# Altium footprint library altium_parts_templates_PCB.PcbLib: 93 footprints (part 2 of 6)
Each footprint in its own frame and in the unit in brackets; x right, y up, seen from the top. Pads: shape width x height; smd on the part's side, far side on the other; paste and mask are expansions set on the pad; w line width, h text height; cw(c..) or ccw(c..) is an arc to the next point about the centre after c.
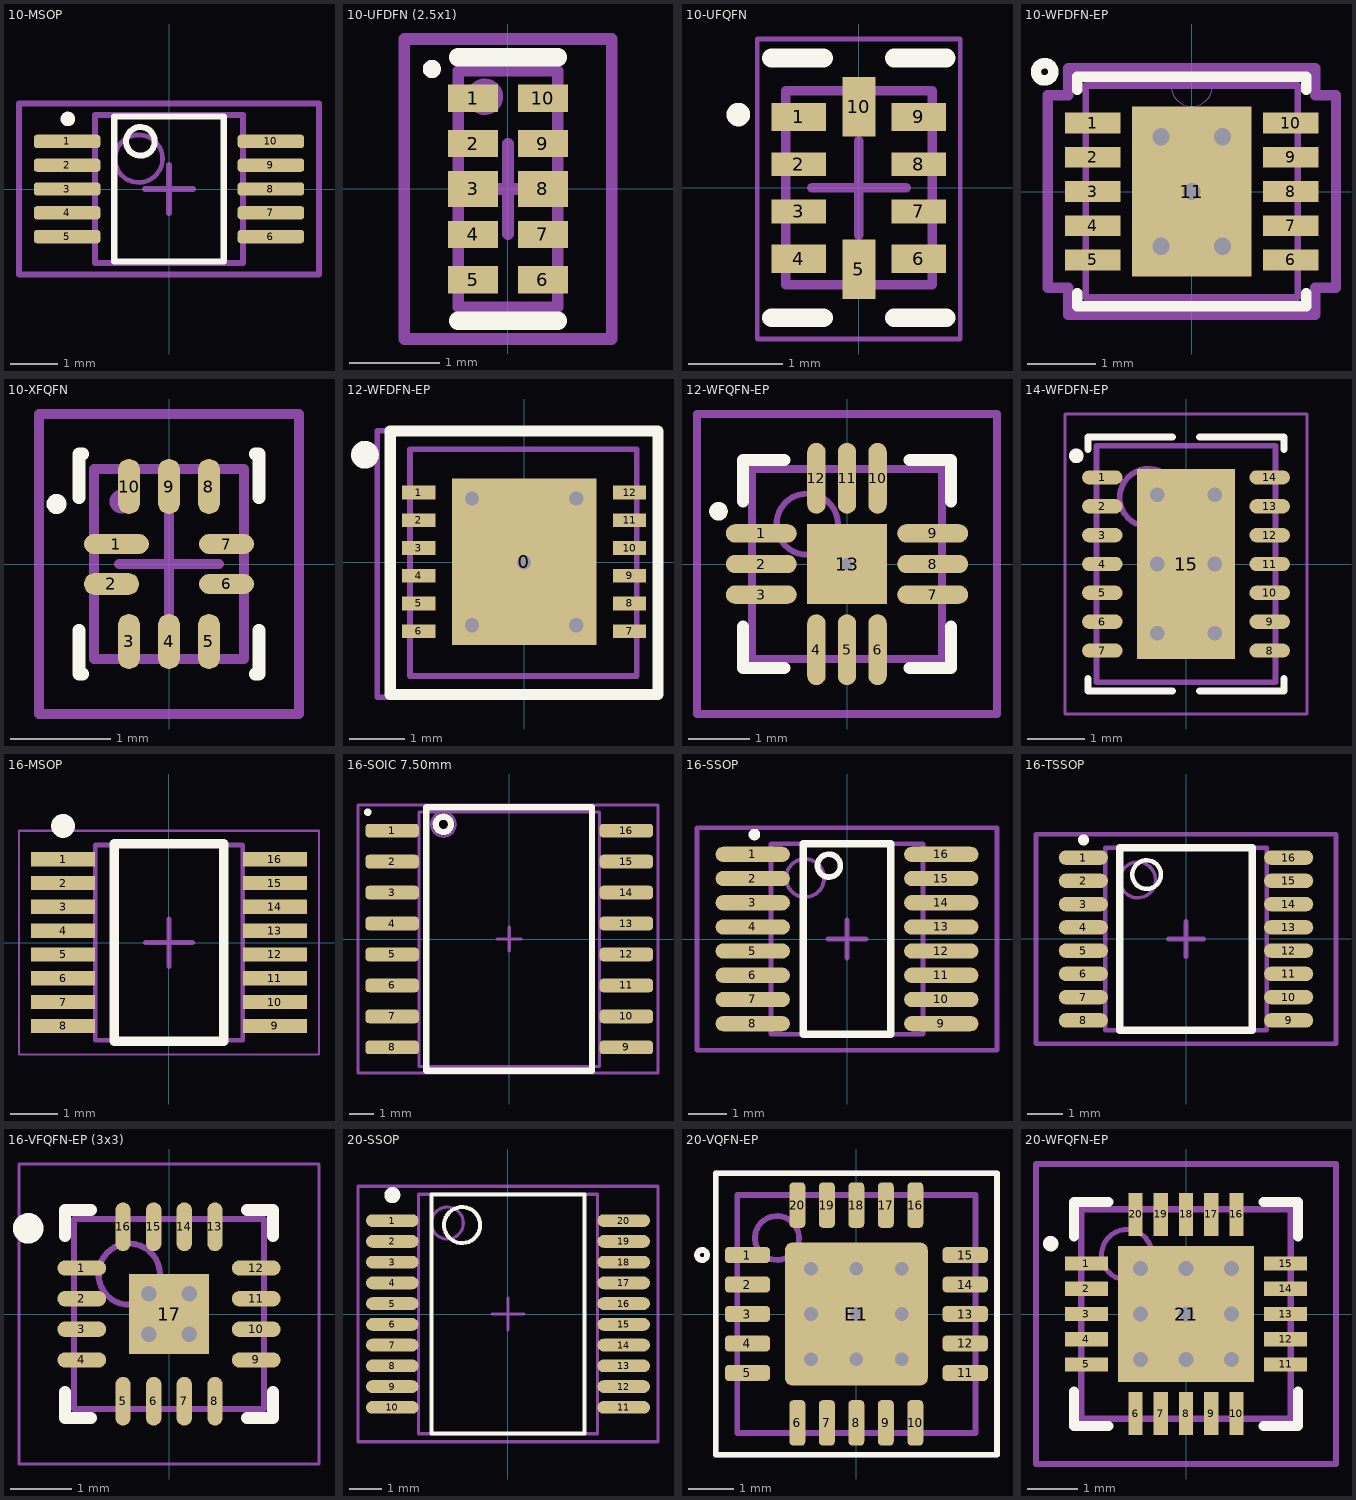
[diagram p1: the footprints below, top view; thin cyan lines are the x and y axes]

## 10-MSOP [mm] "10-MSOP, 10-TFSOP, 10-uMAX"
height 1.1
pads (10):
  rrect50% 1.4x0.28 smd paste+0 mask+0.05: 1(-2.14,1) 2(-2.14,0.5) 3(-2.14,0) 4(-2.14,-0.5) 5(-2.14,-1) 6(2.14,-1) 7(2.14,-0.5) 8(2.14,0) 9(2.14,0.5) 10(2.14,1)
Top Overlay:
  circle w0.152: c-2.125,1.471 r0.076
  circle w0.127: c-0.6,1 r0.3
  lines w0.127: -1.15,-1.525 1.15,-1.525 1.15,1.525 -1.15,1.525 -1.15,-1.525
Top Assembly Drawing:
  circle w0.1: c-0.637,0.637 r0.5
  lines w0.127: -1.55,-1.55 1.55,-1.55 1.55,1.55 -1.55,1.55 -1.55,-1.55
Top Courtyard:
  lines w0.127: -0.5,0 0.5,0 ; 0,-0.5 0,0.5 ; -3.15,-1.8 3.15,-1.8 3.15,1.8 -3.15,1.8 -3.15,-1.8
3D body "REG_REF_MAX6072AAUB25+.step": height 1.1, standoff 0, extent -2.45,-1.55 2.45,1.55

## 10-UFDFN (2.5x1) [mm] "10-UFDFN, 10-USON (2.5x1)"
height 0.55
pads (10):
  rect 0.55x0.3 smd paste+0 mask+0.05: 1(-0.385,1) 2(-0.385,0.5) 4(-0.385,-0.5) 5(-0.385,-1) 6(0.385,-1) 7(0.385,-0.5) 9(0.385,0.5) 10(0.385,1)
  rect 0.55x0.4 smd paste+0 mask+0.05: 3(-0.385,0) 8(0.385,0)
Top Overlay:
  circle w0.1: c-0.838,1.321 r0.05
  lines w0.2: -0.55,-1.45 0.55,-1.45 ; -0.55,1.45 0.55,1.45
Top Assembly Drawing:
  circle w0.1: c-0.254,1.016 r0.15
  lines w0.127: -0.55,-1.3 -0.55,1.3 0.55,1.3 0.55,-1.3 -0.55,-1.3
Top Courtyard:
  lines w0.127: -0.5,0 0.5,0 ; 0,-0.5 0,0.5 ; -1.143,-1.651 1.143,-1.651 1.143,1.651 -1.143,1.651 -1.143,-1.651
3D body: height 0.55, standoff 0, extent -0.55,-1.3 0.55,1.3

## 10-UFQFN [mm] "10-UFQFN, 10-UQFN (2.0x1.5)"
pads (10):
  rect 0.58x0.3 smd: 1(-0.635,0.75) 4(-0.635,-0.75) 6(0.635,-0.75) 9(0.635,0.75)
  rect 0.58x0.25 smd: 2(-0.635,0.25) 3(-0.635,-0.25) 7(0.635,-0.25) 8(0.635,0.25)
  rect 0.35x0.63 smd: 5(0,-0.86) 10(0,0.86)
Top Overlay:
  circle w0.15: c-1.275,0.775 r0.05
  lines w0.2: -0.925,-1.375 -0.375,-1.375 ; -0.925,1.375 -0.375,1.375 ; 0.375,-1.375 0.925,-1.375 ; 0.375,1.375 0.925,1.375
Top 3D Model:
  lines w0.1: -0.775,-1.025 0.775,-1.025 0.775,1.025 -0.775,1.025 -0.775,-1.025
Top Courtyard:
  lines w0.05: -1.075,-1.6 -1.075,1.575 1.075,1.575 1.075,-1.6 -1.075,-1.6
  lines w0.1: -0.5,0 0.5,0 ; 0,-0.5 0,0.5
3D body "User Library-X2QFN-10.step": height 0.39, standoff -0.01, extent -0.75,-1 0.75,1

## 10-WFDFN-EP [mil] "10-WFDFN-EP, 10-DFN (3x3)"
pads (11):
  rect 32x12 smd paste+0 mask+0: 1(-57,39.37) 2(-57,19.68) 3(-57,0) 4(-57,-19.68) 5(-57,-39.37) 6(57,-39.37) 7(57,-19.68) 8(57,0) 9(57,19.68) 10(57,39.37)
  rect 69x98 smd paste-48.5 mask+0: 11(0,0)
via 0,0 diameter 20 hole 10
via -17.72,31.5 diameter 20 hole 10
via 17.72,31.5 diameter 20 hole 10
via 17.72,-31.5 diameter 20 hole 10
via -17.72,-31.5 diameter 20 hole 10
Top Overlay:
  circle w6: c-84.65,68.9 r5
  lines w6: -66,-58.47 -66,-66 66,-66 66,-58.47 ; -66,58.47 -66,66 66,66 66,58.47
Top Paste:
  region: 34.5,49 -34.5,49 -34.5,-49 34.5,-49
Top Assembly Drawing:
  lines w3.94: -61.02,-61.02 61.02,-61.02 61.02,61.02 -61.02,61.02 -61.02,-61.02
Top 3D Model:
  lines w0: -12,61 ccw(c0,61) 12,61
  lines w1: -61,-61 61,-61 61,61 -61,61 -61,-61
Top Courtyard:
  lines w3.94: -9.84,0 9.84,0 ; 0,-9.84 0,9.84
  lines w6: -83,-55.37 -83,55.37 -71,55.37 -71,71 71,71 71,55.37 83,55.37 83,-55.37 71,-55.37 71,-71 -71,-71 -71,-55.37 -83,-55.37
3D body: height 10, standoff 0, extent 0,0 10,10
3D body "DFN-10_DD.stp": height 32.09, standoff 0, extent -60.98,-60.98 60.99,60.99

## 10-XFQFN [mm] "10-XFQFN, 10-XQFN (1.4x1.8)"
height 0.5
pads (10):
  oval 0.65x0.2 smd paste-0.025 mask+0.05: 1(-0.525,0.2)
  oval 0.55x0.22 smd paste-0.025 mask+0.05: 2(-0.575,-0.2)
  oval 0.22x0.55 smd paste-0.025 mask+0.05: 3(-0.4,-0.775) 4(0,-0.775) 5(0.4,-0.775) 8(0.4,0.775) 9(0,0.775) 10(-0.4,0.775)
  oval 0.55x0.2 smd paste-0.025 mask+0.05: 6(0.575,-0.2) 7(0.575,0.2)
Top Overlay:
  circle w0.1: c-1.125,0.6 r0.05
  lines w0.127: -0.9,-0.664 -0.9,-1.1 -0.864,-1.1 ; -0.9,0.663 -0.9,1.1 -0.864,1.1 ; 0.864,-1.1 0.9,-1.1 0.9,-0.664 ; 0.864,1.1 0.9,1.1 0.9,0.663
Top Assembly Drawing:
  circle w0.127: c-0.475,0.625 r0.056
  lines w0.1: -0.75,-0.95 -0.75,0.95 0.75,0.95 0.75,-0.95 -0.75,-0.95
Top Courtyard:
  lines w0.1: -0.5,0 0.5,0 ; 0,-0.5 0,0.5 ; -1.3,-1.5 -1.3,1.5 1.3,1.5 1.3,-1.5 -1.3,-1.5
3D body "LOG_QFN127P600-8N.step": height 0.5, standoff 0, extent -0.8,-1 0.8,1

## 12-WFDFN-EP [mm] "12-WFDFN-EP, 12-WSON (4x4)"
pads (13):
  rect 2.6x3 smd paste-2: 0(0,0.008)
  rect 0.6x0.25 smd: 1(-1.9,1.258) 2(-1.9,0.758) 3(-1.9,0.258) 4(-1.9,-0.242) 5(-1.9,-0.742) 6(-1.9,-1.242) 7(1.9,-1.242) 8(1.9,-0.742) 9(1.9,-0.242) 10(1.9,0.258) 11(1.9,0.758) 12(1.9,1.258)
via 0,0 diameter 0.508 hole 0.254
via -0.94,-1.135 diameter 0.508 hole 0.254
via 0.94,-1.135 diameter 0.508 hole 0.254
via 0.94,1.151 diameter 0.508 hole 0.254
via -0.94,1.151 diameter 0.508 hole 0.254
Top Overlay:
  circle w0.25: c-2.87,1.938 r0.125
  lines w0.2: -0.432,2.37 2.413,2.37 2.413,-2.38 -2.413,-2.38 -2.413,2.37 -0.125,2.37
Top Paste:
  region: 0.1,-0.1 0.1,-1.342 1.15,-1.342 1.15,-0.1
  region: -1.15,-0.1 -1.15,-1.335 -0.1,-1.335 -0.1,-0.1
  region: 1.15,0.1 1.15,1.342 0.1,1.342 0.1,0.1
  region: -0.1,0.1 -0.1,1.35 -1.15,1.35 -1.15,0.1
Top 3D Model:
  lines w0.1: -2.057,-2.05 2.032,-2.05 2.032,2.04 -2.057,2.04 -2.057,-2.05
Top Courtyard:
  lines w0.1: -2.65,-2.431 2.413,-2.431 2.413,2.37 -2.65,2.37 -2.65,-2.431
3D body "DFN-12_4x4mm.STEP": height 0.8, standoff 0, extent -2.06,-2.05 2.06,2.05

## 12-WFQFN-EP [mm] "12-WFQFN-EP, 12-LFCSP-WQ (3x3)"
height 0.8
pads (13):
  oval 1.16x0.3 smd paste-0.025 mask+0.05: 1(-1.4,0.5) 2(-1.4,0) 3(-1.4,-0.5) 7(1.4,-0.5) 8(1.4,0) 9(1.4,0.5)
  oval 0.3x1.16 smd paste-0.025 mask+0.05: 4(-0.5,-1.4) 5(0,-1.4) 6(0.5,-1.4) 10(0.5,1.4) 11(0,1.4) 12(-0.5,1.4)
  rect 1.3x1.3 smd paste-0.025 mask+0.05: 13(0,0)
via 0,0 diameter 0.5 hole 0.2
Top Overlay:
  circle w0.152: c-2.099,0.861 r0.076
  lines w0.2: -1.7,-1.025 -1.7,-1.7 -1.025,-1.7 ; -1.7,1.025 -1.7,1.7 -1.025,1.7 ; 1.025,-1.7 1.7,-1.7 1.7,-1.025 ; 1.025,1.7 1.7,1.7 1.7,1.025
Top Assembly Drawing:
  circle w0.1: c-0.65,0.65 r0.5
  lines w0.127: -1.55,-1.55 1.55,-1.55 1.55,1.55 -1.55,1.55 -1.55,-1.55
Top Courtyard:
  lines w0.127: -0.5,0 0.5,0 ; 0,-0.5 0,0.5 ; -2.45,-2.45 -2.45,2.45 2.45,2.45 2.45,-2.45 -2.45,-2.45
3D body: height 0.8, standoff 0.02, extent -1.55,-1.55 1.55,1.55

## 14-WFDFN-EP [mm] "14-WFDFN-EP, 14-DFN (4x3)"
height 0.75
pads (15):
  oval 0.7x0.25 smd paste-0.025 mask+0.05: 1(-1.45,1.5) 2(-1.45,1) 3(-1.45,0.5) 4(-1.45,0) 5(-1.45,-0.5) 6(-1.45,-1) 7(-1.45,-1.5) 8(1.45,-1.5) 9(1.45,-1) 10(1.45,-0.5) 11(1.45,0) 12(1.45,0.5) 13(1.45,1) 14(1.45,1.5)
  rect 1.7x3.3 smd paste-5 mask+0: 15(0,0)
via 0.5,1.2 diameter 0.508 hole 0.254
via -0.5,-1.2 diameter 0.508 hole 0.254
via -0.5,1.2 diameter 0.508 hole 0.254
via 0.5,-1.2 diameter 0.508 hole 0.254
via 0.5,0 diameter 0.508 hole 0.254
via -0.5,0 diameter 0.508 hole 0.254
Top Overlay:
  circle w0.127: c-1.9,1.875 r0.064
  lines w0.127: -1.7,-1.988 -1.7,-2.2 -0.238,-2.2 ; -1.7,1.988 -1.7,2.2 -0.238,2.2 ; 0.239,-2.2 1.7,-2.2 1.7,-1.988 ; 0.239,2.2 1.7,2.2 1.7,1.988
Top Paste:
  region: 0.8,1.6 0.1,1.6 0.1,0.1 0.8,0.1
  rectangle: -0.8,-1.6 -0.1,-0.1
  region: 0.8,-0.1 0.1,-0.1 0.1,-1.6 0.8,-1.6
  rectangle: -0.8,0.1 -0.1,1.6
Top Assembly Drawing:
  circle w0.1: c-0.65,1.15 r0.5
  lines w0.1: -1.55,-2.05 1.55,-2.05 1.55,2.05 -1.55,2.05 -1.55,-2.05
Top Courtyard:
  lines w0.05: -2.1,-2.6 2.1,-2.6 2.1,2.6 -2.1,2.6 -2.1,-2.6
  lines w0.1: -0.5,0 0.5,0 ; 0,-0.5 0,0.5
3D body "QFN127P600-8N.step": height 0.75, standoff 0, extent -1.6,-2.05 1.6,2.05

## 16-MSOP [mm] "16-MSOP, 16-TFSOP"
height 1.1
pads (16):
  rect 1.35x0.3 smd: 1(-2.225,1.75) 2(-2.225,1.25) 3(-2.225,0.75) 4(-2.225,0.25) 5(-2.225,-0.25) 6(-2.225,-0.75) 7(-2.225,-1.25) 8(-2.225,-1.75) 9(2.225,-1.75) 10(2.225,-1.25) 11(2.225,-0.75) 12(2.225,-0.25) 13(2.225,0.25) 14(2.225,0.75) 15(2.225,1.25) 16(2.225,1.75)
Top Overlay:
  circle w0.25: c-2.225,2.45 r0.125
  lines w0.2: -1.15,-2.075 1.15,-2.075 1.15,2.075 -1.15,2.075 -1.15,-2.075
Top 3D Model:
  lines w0.1: -1.55,-2.05 1.55,-2.05 1.55,2.05 -1.55,2.05 -1.55,-2.05
Top Courtyard:
  lines w0.05: -3.15,-2.35 3.15,-2.35 3.15,2.35 -3.15,2.35 -3.15,-2.35
  lines w0.1: -0.5,0 0.5,0 ; 0,-0.5 0,0.5
3D body "MSOP-16.step": height 0.96, standoff 0.1, extent -2.45,-2.019 2.45,2.019

## 16-SOIC 7.50mm [mil] "16-SOIC"
height 68.9
pads (16):
  rrect50% 86x22 smd paste-0.98 mask+2.76: 1(-188.98,175) 2(-188.98,125) 3(-188.98,75) 4(-188.98,25) 5(-188.98,-25) 6(-188.98,-75) 7(-188.98,-125) 8(-188.98,-175) 9(188.98,-175) 10(188.98,-125) 11(188.98,-75) 12(188.98,-25) 13(188.98,25) 14(188.98,75) 15(188.98,125) 16(188.98,175)
Top Overlay:
  circle w6: c-228.35,204.72 r3
  lines w10: -93.94,185.06 cw(c-106.3,185.04) -93.97,185.9 ; -133.86,-212.6 -133.86,212.6 133.86,212.6 133.86,-212.6 -133.86,-212.6
Top Assembly Drawing:
  circle w3.94: c-106.3,185.04 r19.68
  lines w5: -145.67,-205.71 -145.67,204.72 145.67,204.72 145.67,-205.71 -145.67,-205.71
Top Courtyard:
  lines w5: -19.69,0 19.68,0 ; 0,-19.68 0,19.68 ; -244.09,-216.54 -244.09,216.54 240.16,216.54 240.16,-216.54 -244.09,-216.54
3D body "DW16.stp": height 104.09, standoff 0, extent -209.48,-206.49 209.49,206.5

## 16-SSOP [mm] "16-SSOP, 16-QSOP"
height 1.76
pads (16):
  oval 1.95x0.4 smd paste-0.025 mask+0.07: 1(-2.475,2.222) 2(-2.475,1.587) 3(-2.475,0.953) 4(-2.475,0.318) 5(-2.475,-0.318) 6(-2.475,-0.953) 7(-2.475,-1.587) 8(-2.475,-2.222) 9(2.475,-2.222) 10(2.475,-1.587) 11(2.475,-0.953) 12(2.475,-0.318) 13(2.475,0.318) 14(2.475,0.953) 15(2.475,1.587) 16(2.475,2.222)
Top Overlay:
  circle w0.152: c-2.429,2.741 r0.076
  circle w0.15: c-0.475,1.925 r0.3
  lines w0.2: -1.15,-2.502 1.15,-2.502 ; -1.15,-2.5 -1.15,2.5 ; -1.15,2.502 1.15,2.502 ; 1.15,-2.5 1.15,2.5
Top Assembly Drawing:
  circle w0.1: c-1.1,1.6 r0.5
  lines w0.127: -1.994,-2.502 -1.994,2.502 1.994,2.502 1.994,-2.502 -1.994,-2.502
Top Courtyard:
  lines w0.127: -0.5,0 0.5,0 ; 0,-0.5 0,0.5 ; -3.937,-2.921 -3.937,2.921 3.937,2.921 3.937,-2.921 -3.937,-2.921
3D body: height 1.76, standoff 0.1, extent -2,-2.5 2,2.5

## 16-TSSOP [mil] "16-TSSOP"
height 47.24
pads (16):
  oval 54x16 smd paste-0.98 mask+1.97: 1(-113,89.57) 2(-113,63.98) 3(-113,38.39) 4(-113,12.8) 5(-113,-12.8) 6(-113,-38.39) 7(-113,-63.98) 8(-113,-89.57) 9(113,-89.57) 10(113,-63.98) 11(113,-38.39) 12(113,-12.8) 13(113,12.8) 14(113,38.39) 15(113,63.98) 16(113,89.57)
Top Overlay:
  circle w5: c-43.31,70.87 r15.75
  circle w6: c-112.65,108.91 r3
  lines w7.87: -72.83,-100.39 72.83,-100.39 72.83,100.39 -72.83,100.39 -72.83,-100.39
Top Assembly Drawing:
  circle w3.94: c-53.15,64.96 r19.68
  lines w5: -88.58,-100.39 88.58,-100.39 88.58,100.39 -88.58,100.39 -88.58,-100.39
Top Courtyard:
  lines w5: -19.68,0 19.69,0 ; 0,-19.69 0,19.68 ; -165,-115 165,-115 165,115 -165,115 -165,-115
3D body: height 47.24, standoff 1.97, extent -88.58,-100.39 88.58,100.39

## 16-VFQFN-EP (3x3) [mm] "16-VFQFN-EP,  16-LFCSP-VQ (3x3), 16-QFN (3x3)"
height 0.8
pads (17):
  oval 0.8x0.25 smd: 1(-1.425,0.75) 2(-1.425,0.25) 3(-1.425,-0.25) 4(-1.425,-0.75) 9(1.425,-0.75) 10(1.425,-0.25) 11(1.425,0.25) 12(1.425,0.75)
  oval 0.25x0.8 smd: 5(-0.75,-1.425) 6(-0.25,-1.425) 7(0.25,-1.425) 8(0.75,-1.425) 13(0.75,1.425) 14(0.25,1.425) 15(-0.25,1.425) 16(-0.75,1.425)
  rect 1.3x1.3 smd: 17(0,0)
via 0.33,0.33 diameter 0.508 hole 0.254
via 0.33,-0.33 diameter 0.508 hole 0.254
via -0.33,-0.33 diameter 0.508 hole 0.254
via -0.33,0.33 diameter 0.508 hole 0.254
Top Overlay:
  circle w0.25: c-2.3,1.4 r0.125
  lines w0.2: -1.7,-1.275 -1.7,-1.7 -1.275,-1.7 ; -1.7,1.275 -1.7,1.7 -1.275,1.7 ; 1.275,-1.7 1.7,-1.7 1.7,-1.275 ; 1.275,1.7 1.7,1.7 1.7,1.275
Top 3D Model:
  circle w0.1: c-0.65,0.65 r0.5
  lines w0.1: -1.55,-1.55 -1.55,1.55 1.55,1.55 1.55,-1.55 -1.55,-1.55
Top Courtyard:
  lines w0.05: -2.45,-2.45 -2.45,2.45 2.45,2.45 2.45,-2.45 -2.45,-2.45
  lines w0.1: -0.5,0 0.5,0 ; 0,-0.5 0,0.5
3D body "AMP_INS_ADA4932-1_2.step": height 0.8, standoff 0, extent -1.57,-1.57 1.57,1.57

## 20-SSOP [mm] "20-SSOP"
height 2
pads (20):
  oval 1.65x0.4 smd paste-0.025 mask+0.05: 1(-3.625,2.925) 2(-3.625,2.275) 3(-3.625,1.625) 4(-3.625,0.975) 5(-3.625,0.325) 6(-3.625,-0.325) 7(-3.625,-0.975) 8(-3.625,-1.625) 9(-3.625,-2.275) 10(-3.625,-2.925) 11(3.625,-2.925) 12(3.625,-2.275) 13(3.625,-1.625) 14(3.625,-0.975) 15(3.625,-0.325) 16(3.625,0.325) 17(3.625,0.975) 18(3.625,1.625) 19(3.625,2.275) 20(3.625,2.925)
Top Overlay:
  circle w0.127: c-1.436,2.786 r0.565
  circle w0.25: c-3.625,3.725 r0.125
  lines w0.127: -2.4,-3.75 2.4,-3.75 2.4,3.75 -2.4,3.75 -2.4,-3.75
Top Assembly Drawing:
  circle w0.1: c-1.9,2.85 r0.5
  lines w0.1: -2.8,-3.75 2.8,-3.75 2.8,3.75 -2.8,3.75 -2.8,-3.75
Top Courtyard:
  lines w0.1: -0.5,0 0.5,0 ; 0,-0.5 0,0.5 ; -4.7,-4 4.7,-4 4.7,4 -4.7,4 -4.7,-4
3D body "SOP65P780X200-20N.step": height 2, standoff 0, extent -3.9,-3.75 3.9,3.75

## 20-VQFN-EP [mm] "20-VQFN-EP,  20-VQFN (5x5)"
pads (21):
  rrect50% 1x0.35 smd paste-0.025 mask+0.07: 1(-2.4,1.3) 2(-2.4,0.65) 3(-2.4,0) 4(-2.4,-0.65) 5(-2.4,-1.3) 11(2.4,-1.3) 12(2.4,-0.65) 13(2.4,0) 14(2.4,0.65) 15(2.4,1.3)
  rrect50% 0.35x1 smd paste-0.025 mask+0.07: 6(-1.3,-2.4) 7(-0.65,-2.4) 8(0,-2.4) 9(0.65,-2.4) 10(1.3,-2.4) 16(1.3,2.4) 17(0.65,2.4) 18(0,2.4) 19(-0.65,2.4) 20(-1.3,2.4)
  rrect10% 3.15x3.15 smd paste-1.575 mask+0: E1(0,0)
via -1,-1 diameter 0.508 hole 0.3
via 0,-1 diameter 0.508 hole 0.3
via 1,-1 diameter 0.508 hole 0.3
via 1,0 diameter 0.508 hole 0.3
via 0,0 diameter 0.508 hole 0.3
via -1,0 diameter 0.508 hole 0.3
via -1,1 diameter 0.508 hole 0.3
via 0,1 diameter 0.508 hole 0.3
via 1,1 diameter 0.508 hole 0.3
Top Overlay:
  circle w0.127: c-3.4,1.3 r0.112
  lines w0.127: -3.1,-3.1 3.1,-3.1 3.1,3.1 -3.1,3.1 -3.1,-3.1
Top Paste:
  rectangle: -1.45,0.15 -0.15,1.45
  rectangle: -1.45,-1.45 -0.15,-0.15
  rectangle: 0.15,-1.45 1.45,-0.15
  rectangle: 0.15,0.15 1.45,1.45
Top Assembly Drawing:
  circle w0.127: c-1.75,1.675 r0.485
  lines w0.127: -2.625,-2.625 2.625,-2.625 2.625,2.625 -2.625,2.625 -2.625,-2.625
Top Courtyard:
  lines w0.127: -0.6,0 0.6,0 ; 0,-0.6 0,0.6 ; -3.1,-3.1 -3.1,3.1 3.1,3.1 3.1,-3.1 -3.1,-3.1
3D body "User Library-VQFN-20-1.STEP": height 1, standoff -0.05, extent -2.625,-2.625 2.625,2.625

## 20-WFQFN-EP [mm] "20-WFQFN-EP, 20-QFN (4x4)"
height 0.8
pads (21):
  rect 0.85x0.28 smd paste-0.025 mask+0.07: 1(-1.975,1) 2(-1.975,0.5) 3(-1.975,0) 4(-1.975,-0.5) 5(-1.975,-1) 11(1.975,-1) 12(1.975,-0.5) 13(1.975,0) 14(1.975,0.5) 15(1.975,1)
  rect 0.28x0.85 smd paste-0.025 mask+0.07: 6(-1,-1.975) 7(-0.5,-1.975) 8(0,-1.975) 9(0.5,-1.975) 10(1,-1.975) 16(1,1.975) 17(0.5,1.975) 18(0,1.975) 19(-0.5,1.975) 20(-1,1.975)
  rect 2.7x2.7 smd paste-2.7 mask+0: 21(0,0)
via -0.9,0.9 diameter 0.5 hole 0.3
via 0,0 diameter 0.5 hole 0.3
via 0.9,0.9 diameter 0.5 hole 0.3
via 0.9,0 diameter 0.5 hole 0.3
via 0.9,-0.9 diameter 0.5 hole 0.3
via 0,-0.9 diameter 0.5 hole 0.3
via -0.9,0 diameter 0.5 hole 0.3
via 0,0.9 diameter 0.5 hole 0.3
via -0.9,-0.9 diameter 0.5 hole 0.3
Top Overlay:
  circle w0.152: c-2.683,1.395 r0.076
  lines w0.2: -2.225,-1.54 -2.225,-2.225 -1.54,-2.225 ; -2.225,1.54 -2.225,2.225 -1.54,2.225 ; 1.54,-2.225 2.225,-2.225 2.225,-1.54 ; 1.54,2.225 2.225,2.225 2.225,1.54
Top Paste:
  region: 1.218,-1.206 0.127,-1.206 0.127,-0.064 1.218,-0.064
  region: 1.218,0.064 0.127,0.064 0.127,1.206 1.218,1.206
  region: -1.218,-0.064 -0.127,-0.064 -0.127,-1.206 -1.218,-1.206
  region: -1.218,1.206 -0.127,1.206 -0.127,0.064 -1.218,0.064
Top Assembly Drawing:
  circle w0.1: c-1.175,1.175 r0.5
  lines w0.127: -2.075,-2.075 -2.075,2.075 2.075,2.075 2.075,-2.075 -2.075,-2.075
Top Courtyard:
  lines w0.127: -0.5,0 0.5,0 ; 0,-0.5 0,0.5 ; -2.975,-2.975 -2.975,2.975 2.975,2.975 2.975,-2.975 -2.975,-2.975
3D body: height 0.8, standoff 0, extent -2.075,-2.075 2.075,2.075